# Altium integrated library Connector.IntLib: 152 symbols (continued)
## Header-1*32P (continued)
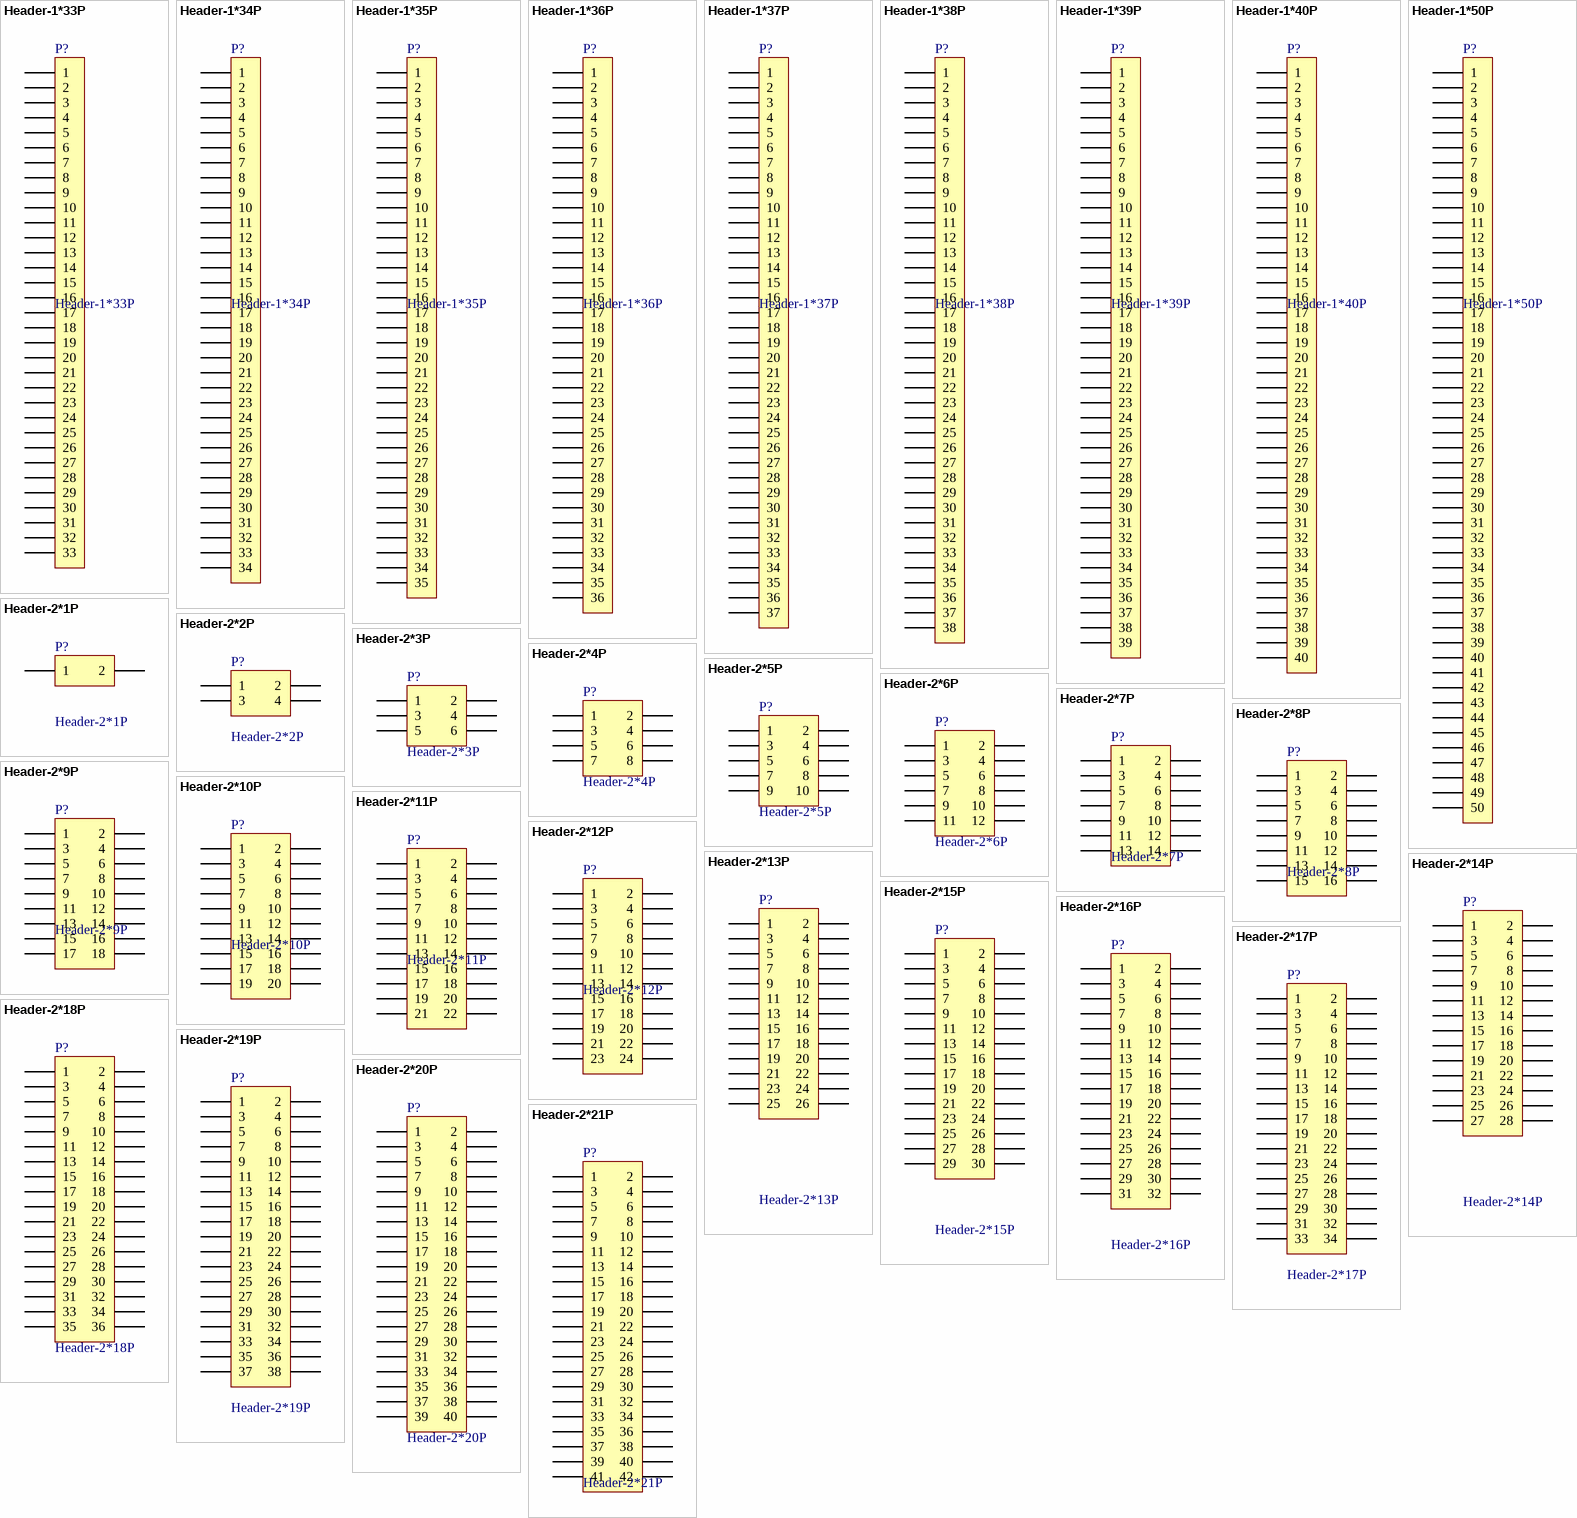
[diagram p6: symbols Header-1*33P to Header-2*21P]

## Header-1*33P
designator P?
Header, 33-Pin
pins: 1, 2, 3, 4, 5, 6, 7, 8, 9, 10, 11, 12, 13, 14, 15, 16, 17, 18, 19, 20, 21, 22, 23, 24, 25, 26, 27, 28, 29, 30, 31, 32, 33

## Header-1*34P
designator P?
Header, 34-Pin; LatestRevisionDate: 17-Jul-2002; LatestRevisionNote: Re-released for DXP Platform.; Publisher: Altium Limited
pins: 1, 2, 3, 4, 5, 6, 7, 8, 9, 10, 11, 12, 13, 14, 15, 16, 17, 18, 19, 20, 21, 22, 23, 24, 25, 26, 27, 28, 29, 30, 31, 32, 33, 34

## Header-1*35P
designator P?
Header, 35-Pin; LatestRevisionDate: 17-Jul-2002; LatestRevisionNote: Re-released for DXP Platform.; Publisher: Altium Limited
pins: 1, 2, 3, 4, 5, 6, 7, 8, 9, 10, 11, 12, 13, 14, 15, 16, 17, 18, 19, 20, 21, 22, 23, 24, 25, 26, 27, 28, 29, 30, 31, 32, 33, 34, 35

## Header-1*36P
designator P?
Header, 36-Pin; LatestRevisionDate: 17-Jul-2002; LatestRevisionNote: Re-released for DXP Platform.; Publisher: Altium Limited
pins: 1, 2, 3, 4, 5, 6, 7, 8, 9, 10, 11, 12, 13, 14, 15, 16, 17, 18, 19, 20, 21, 22, 23, 24, 25, 26, 27, 28, 29, 30, 31, 32, 33, 34, 35, 36

## Header-1*37P
designator P?
Header, 37-Pin; LatestRevisionDate: 17-Jul-2002; LatestRevisionNote: Re-released for DXP Platform.; Publisher: Altium Limited
pins: 1, 2, 3, 4, 5, 6, 7, 8, 9, 10, 11, 12, 13, 14, 15, 16, 17, 18, 19, 20, 21, 22, 23, 24, 25, 26, 27, 28, 29, 30, 31, 32, 33, 34, 35, 36, 37

## Header-1*38P
designator P?
Header, 38-Pin; LatestRevisionDate: 17-Jul-2002; LatestRevisionNote: Re-released for DXP Platform.; Publisher: Altium Limited
pins: 1, 2, 3, 4, 5, 6, 7, 8, 9, 10, 11, 12, 13, 14, 15, 16, 17, 18, 19, 20, 21, 22, 23, 24, 25, 26, 27, 28, 29, 30, 31, 32, 33, 34, 35, 36, 37, 38

## Header-1*39P
designator P?
Header, 39-Pin; LatestRevisionDate: 17-Jul-2002; LatestRevisionNote: Re-released for DXP Platform.; Publisher: Altium Limited
pins: 1, 2, 3, 4, 5, 6, 7, 8, 9, 10, 11, 12, 13, 14, 15, 16, 17, 18, 19, 20, 21, 22, 23, 24, 25, 26, 27, 28, 29, 30, 31, 32, 33, 34, 35, 36, 37, 38, 39

## Header-1*40P
designator P?
Header, 40-Pin; LatestRevisionDate: 17-Jul-2002; LatestRevisionNote: Re-released for DXP Platform.; Publisher: Altium Limited
footprint HEADER_1*40P_FEM_2.0_4.3H
footprint HEADER_1*40P_M_1.27_7.2H
footprint HEADER_1*40P_M_2.0_8.7H
pins: 1, 2, 3, 4, 5, 6, 7, 8, 9, 10, 11, 12, 13, 14, 15, 16, 17, 18, 19, 20, 21, 22, 23, 24, 25, 26, 27, 28, 29, 30, 31, 32, 33, 34, 35, 36, 37, 38, 39, 40

## Header-1*50P
designator P?
Header, 50-Pin; LatestRevisionDate: 17-Jul-2002; LatestRevisionNote: Re-released for DXP Platform.; Publisher: Altium Limited
footprint HEADER_1*50P_M_1.27_7.2H
pins: 1, 2, 3, 4, 5, 6, 7, 8, 9, 10, 11, 12, 13, 14, 15, 16, 17, 18, 19, 20, 21, 22, 23, 24, 25, 26, 27, 28, 29, 30, 31, 32, 33, 34, 35, 36, 37, 38, 39, 40, 41, 42, 43, 44, 45, 46, 47, 48, 49, 50

## Header-2*1P
designator P?
Header, 2*1-Pin, Dual row; LatestRevisionDate: 17-Jul-2002; LatestRevisionNote: Re-released for DXP Platform.; Publisher: Altium Limited
pins: 1, 2

## Header-2*2P
designator P?
Header, 2*2-Pin, Dual row; LatestRevisionDate: 17-Jul-2002; LatestRevisionNote: Re-released for DXP Platform.; Publisher: Altium Limited
footprint HEADER_2*2P_M_2.54_11.5H (Connector; Header; 2x2 Position)
pins: 1, 2, 3, 4

## Header-2*3P
designator P?
Header, 2*3-Pin, Dual row; LatestRevisionDate: 17-Jul-2002; LatestRevisionNote: Re-released for DXP Platform.; Publisher: Altium Limited
footprint HEADER_2*3P_M_2.54_11.5H (Connector; Header; 3x2 Position)
footprint HEADER_2*3P_FEM_2.0_SMT_4.6H_6.5W
footprint HEADER_2*3P_FEM_2.0_SMT_PO_4.6H_6.2W
footprint HEADER_2*3P_M_2.0_SMT_6.5H_6.5W
pins: 1, 2, 3, 4, 5, 6

## Header-2*4P
designator P?
Header, 2*4-Pin, Dual row; LatestRevisionDate: 17-Jul-2002; LatestRevisionNote: Re-released for DXP Platform.; Publisher: Altium Limited
footprint HEADER_2*4P_M_2.54_11.5H (Connector; Header; 4x2 Position)
footprint HEADER_2*4P_FEM_2.0_SMT_4.6H_6.5W
footprint HEADER_2*4P_FEM_2.0_SMT_PO_4.6H_6.2W
footprint HEADER_2*4P_M_2.0_SMT_6.5H_6.5W
pins: 1, 2, 3, 4, 5, 6, 7, 8

## Header-2*5P
designator P?
Header, 2*5-Pin, Dual row; LatestRevisionDate: 17-Jul-2002; LatestRevisionNote: Re-released for DXP Platform.; Publisher: Altium Limited
footprint HEADER_2*5P_M_2.54_11.5H (Connector; Header; 5x2 Position)
footprint HEADER_2*5P_M_2.54_SMT_180D
footprint HEADER_2*5P_FEM_2.0_SMT_4.6H_6.5W
footprint HEADER_2*5P_FEM_2.0_SMT_PO_4.6H_6.2W
footprint HEADER_2*5P_M_2.0_SMT_6.5H_6.5W
pins: 1, 2, 3, 4, 5, 6, 7, 8, 9, 10

## Header-2*6P
designator P?
Header, 2*6-Pin, Dual row; LatestRevisionDate: 17-Jul-2002; LatestRevisionNote: Re-released for DXP Platform.; Publisher: Altium Limited
footprint HEADER_2*6P_M_2.54_11.5H (Connector; Header; 6x2 Position)
footprint HEADER_2*6P_FEM_2.0_SMT_4.6H_6.5W
footprint HEADER_2*6P_FEM_2.0_SMT_PO_4.6H_6.2W
footprint HEADER_2*6P_M_2.0_SMT_6.5H_6.5W
pins: 1, 2, 3, 4, 5, 6, 7, 8, 9, 10, 11, 12

## Header-2*7P
designator P?
Header, 2*7-Pin, Dual row; LatestRevisionDate: 17-Jul-2002; LatestRevisionNote: Re-released for DXP Platform.; Publisher: Altium Limited
footprint HEADER_2*7P_FEM_2.0_SMT_4.6H_6.5W
footprint HEADER_2*7P_FEM_2.0_SMT_PO_4.6H_6.2W
footprint HEADER_2*7P_M_2.0_SMT_6.5H_6.5W
pins: 1, 2, 3, 4, 5, 6, 7, 8, 9, 10, 11, 12, 13, 14

## Header-2*8P
designator P?
Header, 2*8-Pin, Dual row; LatestRevisionDate: 17-Jul-2002; LatestRevisionNote: Re-released for DXP Platform.; Publisher: Altium Limited
footprint HEADER_2*8P_FEM_2.0_SMT_4.6H_6.5W
footprint HEADER_2*8P_FEM_2.0_SMT_PO_4.6H_6.2W
footprint HEADER_2*8P_M_2.0_SMT_6.5H_6.5W
pins: 1, 2, 3, 4, 5, 6, 7, 8, 9, 10, 11, 12, 13, 14, 15, 16

## Header-2*9P
designator P?
Header, 2*9-Pin, Dual row; LatestRevisionDate: 17-Jul-2002; LatestRevisionNote: Re-released for DXP Platform.; Publisher: Altium Limited
pins: 1, 2, 3, 4, 5, 6, 7, 8, 9, 10, 11, 12, 13, 14, 15, 16, 17, 18

## Header-2*10P
designator P?
Header, 2*10-Pin, Dual row; LatestRevisionDate: 17-Jul-2002; LatestRevisionNote: Re-released for DXP Platform.; Publisher: Altium Limited
footprint HEADER_2*10P_FEM_2.0_SMT_4.6H_6.5W
footprint HEADER_2*10P_FEM_2.0_SMT_PO_4.6H_6.2W
footprint HEADER_2*10P_M_2.0_SMT_6.5H_6.5W
footprint HEADER_2*10P_M_2.54_11.5H
pins: 1, 2, 3, 4, 5, 6, 7, 8, 9, 10, 11, 12, 13, 14, 15, 16, 17, 18, 19, 20

## Header-2*11P
designator P?
Header, 2*11-Pin, Dual row; LatestRevisionDate: 17-Jul-2002; LatestRevisionNote: Re-released for DXP Platform.; Publisher: Altium Limited
pins: 1, 2, 3, 4, 5, 6, 7, 8, 9, 10, 11, 12, 13, 14, 15, 16, 17, 18, 19, 20, 21, 22

## Header-2*12P
designator P?
Header, 2*12-Pin, Dual row; LatestRevisionDate: 17-Jul-2002; LatestRevisionNote: Re-released for DXP Platform.; Publisher: Altium Limited
footprint HEADER_2*12P_FEM_2.0_SMT_4.6H_6.5W
footprint HEADER_2*12P_FEM_2.0_SMT_PO_4.6H_6.2W
footprint HEADER_2*12P_M_2.0_SMT_6.5H_6.5W
pins: 1, 2, 3, 4, 5, 6, 7, 8, 9, 10, 11, 12, 13, 14, 15, 16, 17, 18, 19, 20, 21, 22, 23, 24

## Header-2*13P
designator P?
Header, 2*13-Pin, Dual row; LatestRevisionDate: 17-Jul-2002; LatestRevisionNote: Re-released for DXP Platform.; Publisher: Altium Limited
pins: 1, 2, 3, 4, 5, 6, 7, 8, 9, 10, 11, 12, 13, 14, 15, 16, 17, 18, 19, 20, 21, 22, 23, 24, 25, 26

## Header-2*14P
designator P?
Header, 2*14-Pin, Dual row; LatestRevisionDate: 17-Jul-2002; LatestRevisionNote: Re-released for DXP Platform.; Publisher: Altium Limited
pins: 1, 2, 3, 4, 5, 6, 7, 8, 9, 10, 11, 12, 13, 14, 15, 16, 17, 18, 19, 20, 21, 22, 23, 24, 25, 26, 27, 28

## Header-2*15P
designator P?
Header, 2*15-Pin, Dual row; LatestRevisionDate: 17-Jul-2002; LatestRevisionNote: Re-released for DXP Platform.; Publisher: Altium Limited
footprint HEADER_2*15P_FEM_2.0_SMT_4.6H_6.5W
footprint HEADER_2*15P_FEM_2.0_SMT_PO_4.6H_6.2W
footprint HEADER_2*15P_M_2.0_SMT_6.5H_6.5W
footprint HEADER_2*15P_M_2.54_11.5H (Connector; Header; 18x2 Position)
pins: 1, 2, 3, 4, 5, 6, 7, 8, 9, 10, 11, 12, 13, 14, 15, 16, 17, 18, 19, 20, 21, 22, 23, 24, 25, 26, 27, 28, 29, 30

## Header-2*16P
designator P?
Header, 2*16-Pin, Dual row; LatestRevisionDate: 17-Jul-2002; LatestRevisionNote: Re-released for DXP Platform.; Publisher: Altium Limited
pins: 1, 2, 3, 4, 5, 6, 7, 8, 9, 10, 11, 12, 13, 14, 15, 16, 17, 18, 19, 20, 21, 22, 23, 24, 25, 26, 27, 28, 29, 30, 31, 32

## Header-2*17P
designator P?
Header, 2*17-Pin, Dual row; LatestRevisionDate: 17-Jul-2002; LatestRevisionNote: Re-released for DXP Platform.; Publisher: Altium Limited
pins: 1, 2, 3, 4, 5, 6, 7, 8, 9, 10, 11, 12, 13, 14, 15, 16, 17, 18, 19, 20, 21, 22, 23, 24, 25, 26, 27, 28, 29, 30, 31, 32, 33, 34

## Header-2*18P
designator P?
Header, 2*18-Pin, Dual row; LatestRevisionDate: 17-Jul-2002; LatestRevisionNote: Re-released for DXP Platform.; Publisher: Altium Limited
footprint HEADER_2*18P_M_2.54_11.5H (Connector; Header; 18x2 Position)
pins: 1, 2, 3, 4, 5, 6, 7, 8, 9, 10, 11, 12, 13, 14, 15, 16, 17, 18, 19, 20, 21, 22, 23, 24, 25, 26, 27, 28, 29, 30, 31, 32, 33, 34, 35, 36

## Header-2*19P
designator P?
Header, 2*19-Pin, Dual row; LatestRevisionDate: 17-Jul-2002; LatestRevisionNote: Re-released for DXP Platform.; Publisher: Altium Limited
pins: 1, 2, 3, 4, 5, 6, 7, 8, 9, 10, 11, 12, 13, 14, 15, 16, 17, 18, 19, 20, 21, 22, 23, 24, 25, 26, 27, 28, 29, 30, 31, 32, 33, 34, 35, 36, 37, 38

## Header-2*20P
designator P?
Header, 2*20-Pin, Dual row; LatestRevisionDate: 17-Jul-2002; LatestRevisionNote: Re-released for DXP Platform.; Publisher: Altium Limited
footprint HEADER_2*20P_FEM_2.54_8.5H
footprint HEADER_2*20P_FEM_2.0_SMT_4.6H_6.5W
footprint HEADER_2*20P_FEM_2.0_SMT_PO_4.6H_6.2W
footprint HEADER_2*20P_M_2.0_SMT_6.5H_6.5W
footprint HEADER_2*20P_M_2.0_4.3H
pins: 1, 2, 3, 4, 5, 6, 7, 8, 9, 10, 11, 12, 13, 14, 15, 16, 17, 18, 19, 20, 21, 22, 23, 24, 25, 26, 27, 28, 29, 30, 31, 32, 33, 34, 35, 36, 37, 38, 39, 40

## Header-2*21P
designator P?
Header, 2*21-Pin, Dual row
pins: 1, 2, 3, 4, 5, 6, 7, 8, 9, 10, 11, 12, 13, 14, 15, 16, 17, 18, 19, 20, 21, 22, 23, 24, 25, 26, 27, 28, 29, 30, 31, 32, 33, 34, 35, 36, 37, 38, 39, 40, 41, 42

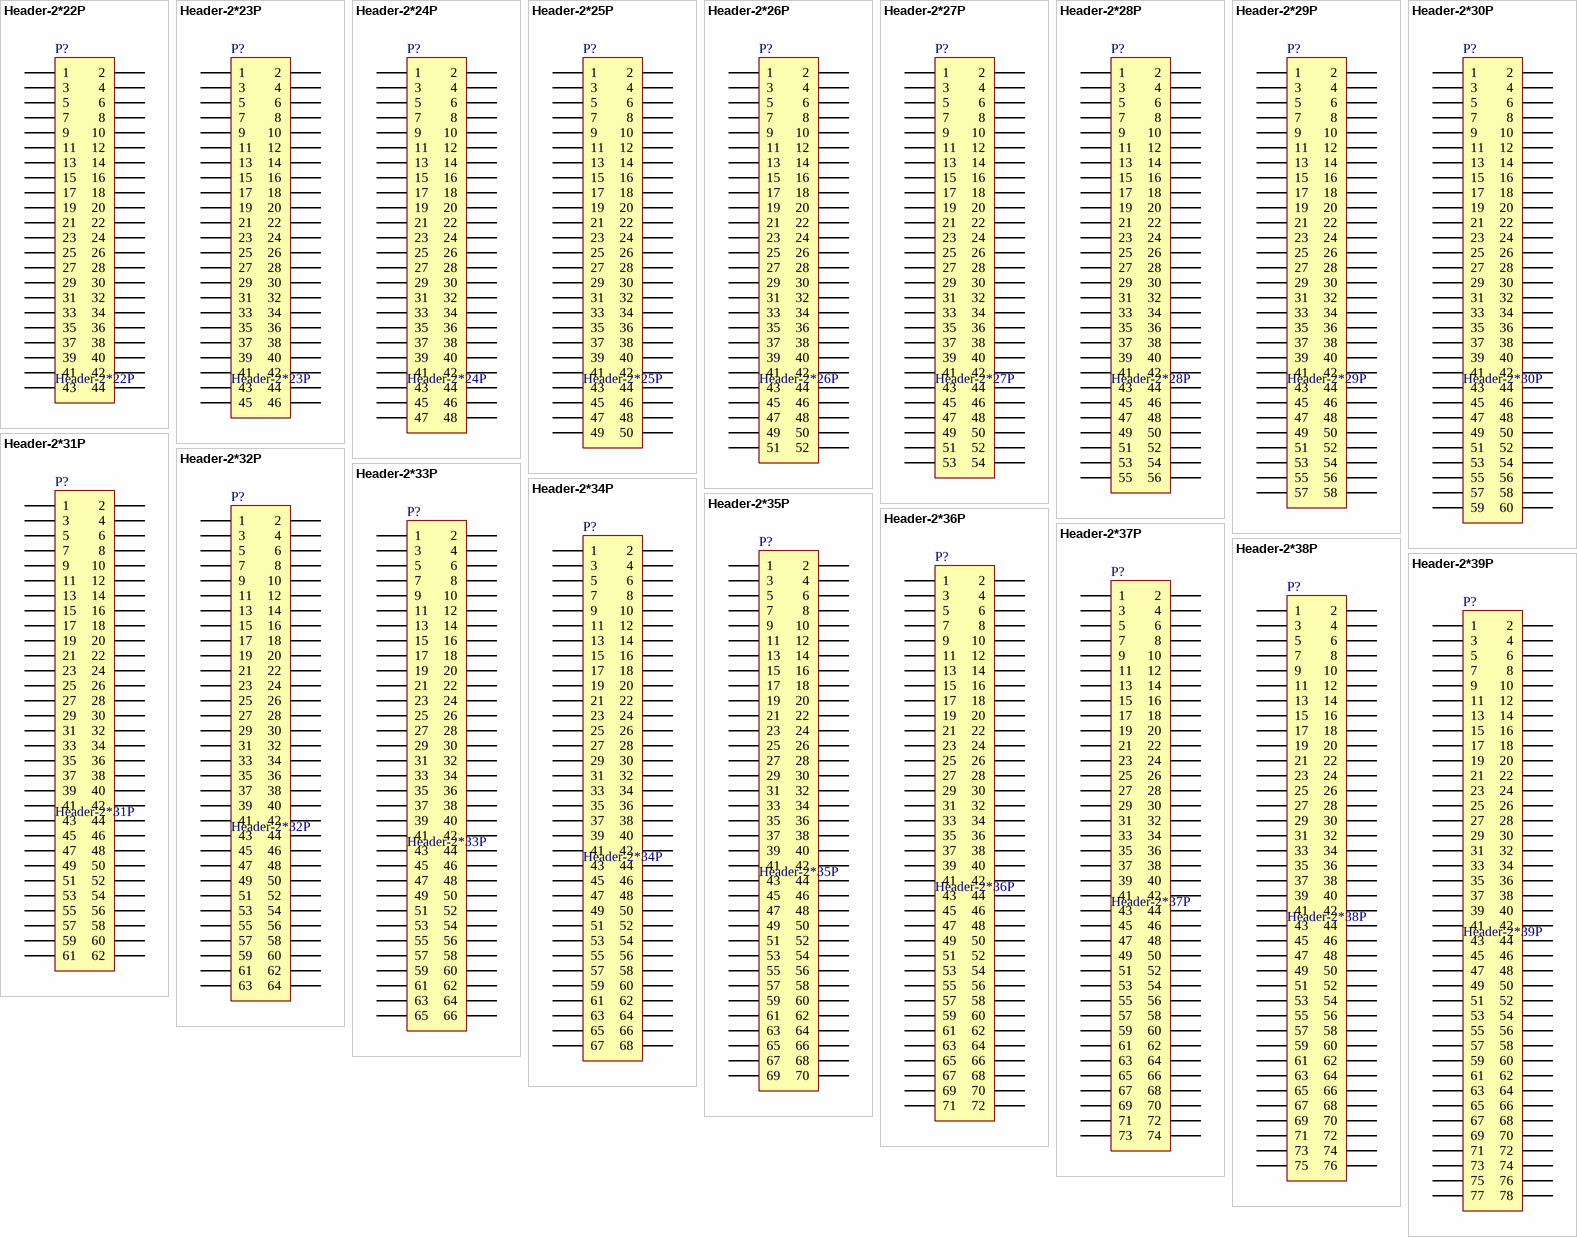
[diagram p7: symbols Header-2*22P to Header-2*39P]

## Header-2*22P
designator P?
Header, 2*22-Pin, Dual row
pins: 1, 2, 3, 4, 5, 6, 7, 8, 9, 10, 11, 12, 13, 14, 15, 16, 17, 18, 19, 20, 21, 22, 23, 24, 25, 26, 27, 28, 29, 30, 31, 32, 33, 34, 35, 36, 37, 38, 39, 40, 41, 42, 43, 44

## Header-2*23P
designator P?
Header, 2*23-Pin, Dual row
pins: 1, 2, 3, 4, 5, 6, 7, 8, 9, 10, 11, 12, 13, 14, 15, 16, 17, 18, 19, 20, 21, 22, 23, 24, 25, 26, 27, 28, 29, 30, 31, 32, 33, 34, 35, 36, 37, 38, 39, 40, 41, 42, 43, 44, 45, 46

## Header-2*24P
designator P?
Header, 2*24-Pin, Dual row
pins: 1, 2, 3, 4, 5, 6, 7, 8, 9, 10, 11, 12, 13, 14, 15, 16, 17, 18, 19, 20, 21, 22, 23, 24, 25, 26, 27, 28, 29, 30, 31, 32, 33, 34, 35, 36, 37, 38, 39, 40, 41, 42, 43, 44, 45, 46, 47, 48

## Header-2*25P
designator P?
Header, 2*25-Pin, Dual row
pins: 1, 2, 3, 4, 5, 6, 7, 8, 9, 10, 11, 12, 13, 14, 15, 16, 17, 18, 19, 20, 21, 22, 23, 24, 25, 26, 27, 28, 29, 30, 31, 32, 33, 34, 35, 36, 37, 38, 39, 40, 41, 42, 43, 44, 45, 46, 47, 48, 49, 50

## Header-2*26P
designator P?
Header, 2*26-Pin, Dual row
pins: 1, 2, 3, 4, 5, 6, 7, 8, 9, 10, 11, 12, 13, 14, 15, 16, 17, 18, 19, 20, 21, 22, 23, 24, 25, 26, 27, 28, 29, 30, 31, 32, 33, 34, 35, 36, 37, 38, 39, 40, 41, 42, 43, 44, 45, 46, 47, 48, 49, 50, 51, 52

## Header-2*27P
designator P?
Header, 2*27-Pin, Dual row
pins: 1, 2, 3, 4, 5, 6, 7, 8, 9, 10, 11, 12, 13, 14, 15, 16, 17, 18, 19, 20, 21, 22, 23, 24, 25, 26, 27, 28, 29, 30, 31, 32, 33, 34, 35, 36, 37, 38, 39, 40, 41, 42, 43, 44, 45, 46, 47, 48, 49, 50, 51, 52, 53, 54

## Header-2*28P
designator P?
Header, 2*28-Pin, Dual row
pins: 1, 2, 3, 4, 5, 6, 7, 8, 9, 10, 11, 12, 13, 14, 15, 16, 17, 18, 19, 20, 21, 22, 23, 24, 25, 26, 27, 28, 29, 30, 31, 32, 33, 34, 35, 36, 37, 38, 39, 40, 41, 42, 43, 44, 45, 46, 47, 48, 49, 50, 51, 52, 53, 54, 55, 56

## Header-2*29P
designator P?
Header, 2*29-Pin, Dual row
pins: 1, 2, 3, 4, 5, 6, 7, 8, 9, 10, 11, 12, 13, 14, 15, 16, 17, 18, 19, 20, 21, 22, 23, 24, 25, 26, 27, 28, 29, 30, 31, 32, 33, 34, 35, 36, 37, 38, 39, 40, 41, 42, 43, 44, 45, 46, 47, 48, 49, 50, 51, 52, 53, 54, 55, 56, 57, 58

## Header-2*30P
designator P?
Header, 2*30-Pin, Dual row
pins: 1, 2, 3, 4, 5, 6, 7, 8, 9, 10, 11, 12, 13, 14, 15, 16, 17, 18, 19, 20, 21, 22, 23, 24, 25, 26, 27, 28, 29, 30, 31, 32, 33, 34, 35, 36, 37, 38, 39, 40, 41, 42, 43, 44, 45, 46, 47, 48, 49, 50, 51, 52, 53, 54, 55, 56, 57, 58, 59, 60

## Header-2*31P
designator P?
Header, 2*31-Pin, Dual row
pins: 1, 2, 3, 4, 5, 6, 7, 8, 9, 10, 11, 12, 13, 14, 15, 16, 17, 18, 19, 20, 21, 22, 23, 24, 25, 26, 27, 28, 29, 30, 31, 32, 33, 34, 35, 36, 37, 38, 39, 40, 41, 42, 43, 44, 45, 46, 47, 48, 49, 50, 51, 52, 53, 54, 55, 56, 57, 58, 59, 60, 61, 62

## Header-2*32P
designator P?
Header, 2*32-Pin, Dual row
pins: 1, 2, 3, 4, 5, 6, 7, 8, 9, 10, 11, 12, 13, 14, 15, 16, 17, 18, 19, 20, 21, 22, 23, 24, 25, 26, 27, 28, 29, 30, 31, 32, 33, 34, 35, 36, 37, 38, 39, 40, 41, 42, 43, 44, 45, 46, 47, 48, 49, 50, 51, 52, 53, 54, 55, 56, 57, 58, 59, 60, 61, 62, 63, 64

## Header-2*33P
designator P?
Header, 2*33-Pin, Dual row
pins: 1, 2, 3, 4, 5, 6, 7, 8, 9, 10, 11, 12, 13, 14, 15, 16, 17, 18, 19, 20, 21, 22, 23, 24, 25, 26, 27, 28, 29, 30, 31, 32, 33, 34, 35, 36, 37, 38, 39, 40, 41, 42, 43, 44, 45, 46, 47, 48, 49, 50, 51, 52, 53, 54, 55, 56, 57, 58, 59, 60, 61, 62, 63, 64, 65, 66

## Header-2*34P
designator P?
Header, 2*34-Pin, Dual row
pins: 1, 2, 3, 4, 5, 6, 7, 8, 9, 10, 11, 12, 13, 14, 15, 16, 17, 18, 19, 20, 21, 22, 23, 24, 25, 26, 27, 28, 29, 30, 31, 32, 33, 34, 35, 36, 37, 38, 39, 40, 41, 42, 43, 44, 45, 46, 47, 48, 49, 50, 51, 52, 53, 54, 55, 56, 57, 58, 59, 60, 61, 62, 63, 64, 65, 66, 67, 68

## Header-2*35P
designator P?
Header, 2*35-Pin, Dual row; LatestRevisionDate: 17-Jul-2002; LatestRevisionNote: Re-released for DXP Platform.; Publisher: Altium Limited
pins: 1, 2, 3, 4, 5, 6, 7, 8, 9, 10, 11, 12, 13, 14, 15, 16, 17, 18, 19, 20, 21, 22, 23, 24, 25, 26, 27, 28, 29, 30, 31, 32, 33, 34, 35, 36, 37, 38, 39, 40, 41, 42, 43, 44, 45, 46, 47, 48, 49, 50, 51, 52, 53, 54, 55, 56, 57, 58, 59, 60, 61, 62, 63, 64, 65, 66, 67, 68, 69, 70

## Header-2*36P
designator P?
Header, 2*36-Pin, Dual row; LatestRevisionDate: 17-Jul-2002; LatestRevisionNote: Re-released for DXP Platform.; Publisher: Altium Limited
pins: 1, 2, 3, 4, 5, 6, 7, 8, 9, 10, 11, 12, 13, 14, 15, 16, 17, 18, 19, 20, 21, 22, 23, 24, 25, 26, 27, 28, 29, 30, 31, 32, 33, 34, 35, 36, 37, 38, 39, 40, 41, 42, 43, 44, 45, 46, 47, 48, 49, 50, 51, 52, 53, 54, 55, 56, 57, 58, 59, 60, 61, 62, 63, 64, 65, 66, 67, 68, 69, 70, 71, 72

## Header-2*37P
designator P?
Header, 2*37-Pin, Dual row; LatestRevisionDate: 17-Jul-2002; LatestRevisionNote: Re-released for DXP Platform.; Publisher: Altium Limited
pins: 1, 2, 3, 4, 5, 6, 7, 8, 9, 10, 11, 12, 13, 14, 15, 16, 17, 18, 19, 20, 21, 22, 23, 24, 25, 26, 27, 28, 29, 30, 31, 32, 33, 34, 35, 36, 37, 38, 39, 40, 41, 42, 43, 44, 45, 46, 47, 48, 49, 50, 51, 52, 53, 54, 55, 56, 57, 58, 59, 60, 61, 62, 63, 64, 65, 66, 67, 68, 69, 70, 71, 72, 73, 74

## Header-2*38P
designator P?
Header, 2*38-Pin, Dual row; LatestRevisionDate: 17-Jul-2002; LatestRevisionNote: Re-released for DXP Platform.; Publisher: Altium Limited
pins: 1, 2, 3, 4, 5, 6, 7, 8, 9, 10, 11, 12, 13, 14, 15, 16, 17, 18, 19, 20, 21, 22, 23, 24, 25, 26, 27, 28, 29, 30, 31, 32, 33, 34, 35, 36, 37, 38, 39, 40, 41, 42, 43, 44, 45, 46, 47, 48, 49, 50, 51, 52, 53, 54, 55, 56, 57, 58, 59, 60, 61, 62, 63, 64, 65, 66, 67, 68, 69, 70, 71, 72, 73, 74, 75, 76

## Header-2*39P
designator P?
Header, 2*39-Pin, Dual row; LatestRevisionDate: 17-Jul-2002; LatestRevisionNote: Re-released for DXP Platform.; Publisher: Altium Limited
pins: 1, 2, 3, 4, 5, 6, 7, 8, 9, 10, 11, 12, 13, 14, 15, 16, 17, 18, 19, 20, 21, 22, 23, 24, 25, 26, 27, 28, 29, 30, 31, 32, 33, 34, 35, 36, 37, 38, 39, 40, 41, 42, 43, 44, 45, 46, 47, 48, 49, 50, 51, 52, 53, 54, 55, 56, 57, 58, 59, 60, 61, 62, 63, 64, 65, 66, 67, 68, 69, 70, 71, 72, 73, 74, 75, 76, 77, 78

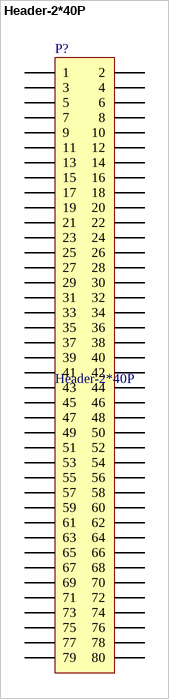
[diagram p8: symbol Header-2*40P]

## Header-2*40P
designator P?
Header, 2*40-Pin, Dual row; LatestRevisionDate: 17-Jul-2002; LatestRevisionNote: Re-released for DXP Platform.; Publisher: Altium Limited
footprint HEADER_2*40P_FEM_2.0_SMT_4.6H_6.5W
footprint HEADER_2*40P_FEM_2.0_SMT_PO_4.6H_6.2W
footprint HEADER_2*40P_M_2.0_SMT_6.5H_6.5W
pins: 1, 2, 3, 4, 5, 6, 7, 8, 9, 10, 11, 12, 13, 14, 15, 16, 17, 18, 19, 20, 21, 22, 23, 24, 25, 26, 27, 28, 29, 30, 31, 32, 33, 34, 35, 36, 37, 38, 39, 40, 41, 42, 43, 44, 45, 46, 47, 48, 49, 50, 51, 52, 53, 54, 55, 56, 57, 58, 59, 60, 61, 62, 63, 64, 65, 66, 67, 68, 69, 70, 71, 72, 73, 74, 75, 76, 77, 78, 79, 80


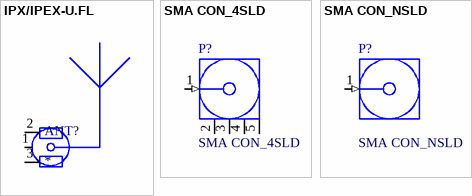
[diagram p9: symbols IPX/IPEX-U.FL to SMA CON_NSLD]

## IPX/IPEX-U.FL
designator ANT?
footprint IPX/IPEX-U.FL_SMT
pins: 1, 2, 3

## SMA CON_4SLD
designator P?
SMA CON; PCB_Layout: Complies with manufacturer's recommendation.; DrillSize: Corresponds to nominal value.; Published: 15-Jul-2004; LatestRevisionDate: 15-Jul-2004; LatestRevisionNote: Component Replaced.; DatasheetDocument: 30-May-2003; PackageDocument: 04-Jul-1999; PackageReference: 919-119J-51AX; Publisher: Altium Limited; ComponentLink1Description: Manufacturer Link; ComponentLink1URL: http://www.amphenolrf.com/
footprint SMA_KE
footprint SMA_KWE
footprint SMA_KHD
pins: 1 Signal (in) "Signal Pin", 2 GND (power), 3 GND (power), 4 GND (power), 5 GND (power)

## SMA CON_NSLD
designator P?
SMA CON; PCB_Layout: Complies with manufacturer's recommendation.; DrillSize: Corresponds to nominal value.; Published: 15-Jul-2004; LatestRevisionDate: 15-Jul-2004; LatestRevisionNote: Component Replaced.; DatasheetDocument: 30-May-2003; PackageDocument: 04-Jul-1999; PackageReference: 919-119J-51AX; Publisher: Altium Limited; ComponentLink1Description: Manufacturer Link; ComponentLink1URL: http://www.amphenolrf.com/
footprint SMA_KFD_NSLD_2PHL
footprint SMA_KFD_NSLD_4PHL
pins: 1 Signal (in) "Signal Pin"


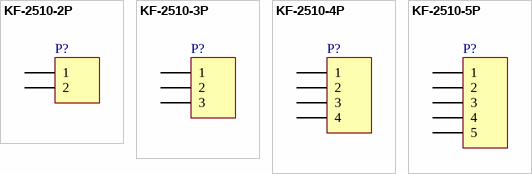
[diagram p10: symbols KF-2510-2P to KF-2510-5P]

## KF-2510-2P
designator P?
Header, 2510,2-Pin; LatestRevisionDate: 17-Jul-2002; LatestRevisionNote: Re-released for DXP Platform.; Publisher: Altium Limited
footprint KF2510-2.54_2P_AW
pins: 1, 2

## KF-2510-3P
designator P?
Header, 2510,3-Pin; LatestRevisionDate: 17-Jul-2002; LatestRevisionNote: Re-released for DXP Platform.; Publisher: Altium Limited
footprint KF2510-2.54_3P_AW
pins: 1, 2, 3

## KF-2510-4P
designator P?
Header, 2510,4-Pin; LatestRevisionDate: 17-Jul-2002; LatestRevisionNote: Re-released for DXP Platform.; Publisher: Altium Limited
footprint KF2510-2.54_4P_AW
pins: 1, 2, 3, 4

## KF-2510-5P
designator P?
Header, 2510,5-Pin; LatestRevisionDate: 17-Jul-2002; LatestRevisionNote: Re-released for DXP Platform.; Publisher: Altium Limited
footprint KF2510-2.54_5P_AW
pins: 1, 2, 3, 4, 5


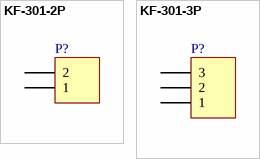
[diagram p11: symbols KF-301-2P to KF-301-3P]

## KF-301-2P
designator P?
Header, kf301,2-Pin; LatestRevisionDate: 17-Jul-2002; LatestRevisionNote: Re-released for DXP Platform.; Publisher: Altium Limited
footprint KF301-5.08_2P
pins: 1, 2

## KF-301-3P
designator P?
Header, kf301,3-Pin; LatestRevisionDate: 17-Jul-2002; LatestRevisionNote: Re-released for DXP Platform.; Publisher: Altium Limited
footprint KF301-5.08_3P
pins: 1, 2, 3


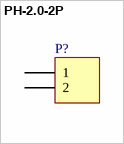
[diagram p12: symbol PH-2.0-2P]

## PH-2.0-2P
designator P?
Header, 2-Pin; LatestRevisionDate: 17-Jul-2002; LatestRevisionNote: Re-released for DXP Platform.; Publisher: Altium Limited
footprint PH-2.0_2P_A
footprint PH-2.0_2P_AW
pins: 1, 2


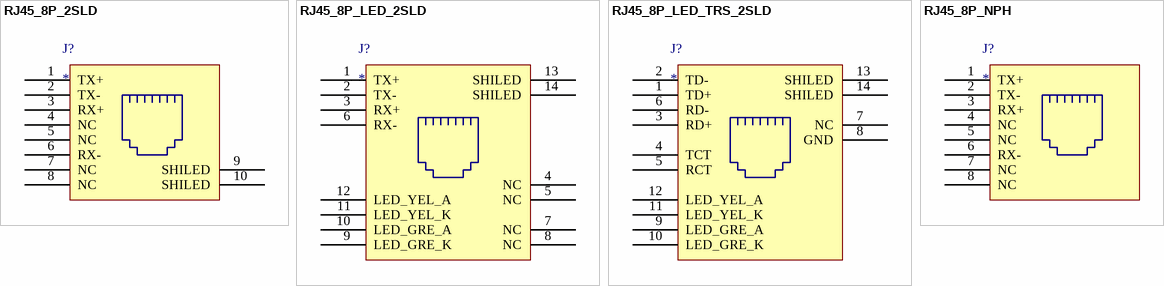
[diagram p13: symbols RJ45_8P_2SLD to RJ45_8P_NPH]

## RJ45_8P_2SLD
designator J?
footprint RJ45-8P_18.4L*15.8W*13.35H (Ckmtw R-RJ45R10P-B000)
footprint RJ45-8P_15.75L*16.26W*13.1H (Ckmtw,R-RJ45R08P-B000)
pins: 1 TX+, 2 TX-, 3 RX+, 4 NC, 5 NC, 6 RX-, 7 NC, 8 NC, 9 SHILED, 10 SHILED

## RJ45_8P_LED_2SLD
designator J?
footprint RJ45-8P-LED_15.75L*16.51W*13.46H (HR911103A)
pins: 1 TX+, 2 TX-, 3 RX+, 4 NC, 5 NC, 6 RX-, 7 NC, 8 NC, 9 LED_GRE_K, 10 LED_GRE_A, 11 LED_YEL_K, 12 LED_YEL_A, 13 SHILED, 14 SHILED

## RJ45_8P_LED_TRS_2SLD
designator J?
footprint RJ45-8P-LED_21.3L*16W*13.5H (HR911103A)
pins: 1 TD+, 2 TD-, 3 RD+, 4 TCT, 5 RCT, 6 RD-, 7 NC, 8 GND, 9 LED_GRE_A, 10 LED_GRE_K, 11 LED_YEL_K, 12 LED_YEL_A, 13 SHILED, 14 SHILED

## RJ45_8P_NPH
designator J?
footprint RJ45-8P_15.1L*15.9W*12.6H
pins: 1 TX+, 2 TX-, 3 RX+, 4 NC, 5 NC, 6 RX-, 7 NC, 8 NC


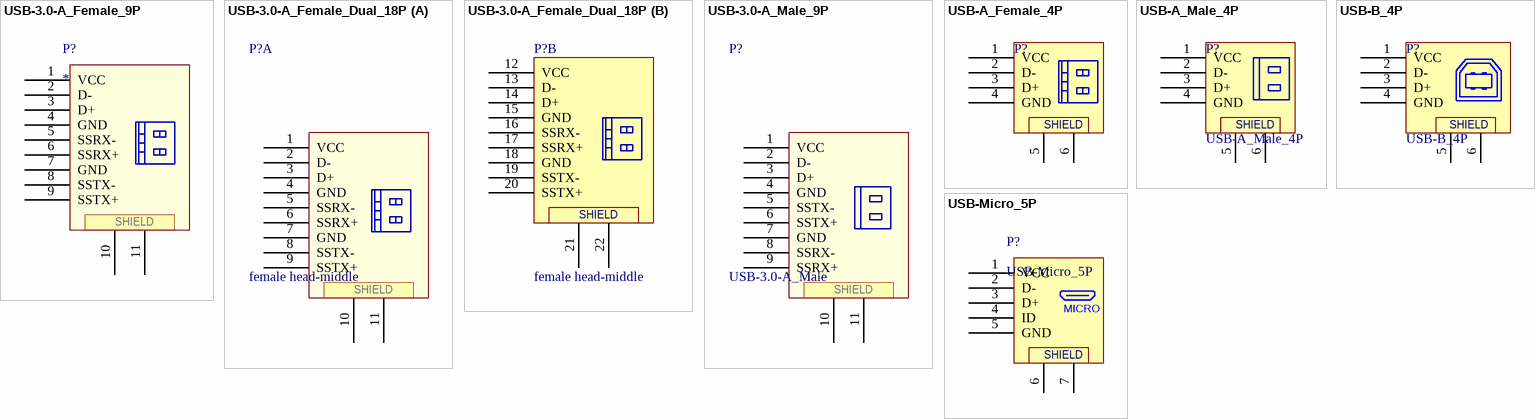
[diagram p14: symbols USB-3.0-A_Female_9P to USB-Micro_5P]

## USB-3.0-A_Female_9P
designator P?
footprint USB3.0-A_FEMALE_90_KPIN
footprint USB3.0-A_FEMALE_180_KPIN
footprint USB3.0-A_FEMALE_90_SIDE
footprint USB3.0-A_FEM_180_11.5H_NEC
pins: 1 VCC, 2 D-, 3 D+, 4 GND, 5 SSRX-, 6 SSRX+, 7 GND, 8 SSTX-, 9 SSTX+, 10 SHIELD, 11 SHIELD

## USB-3.0-A_Female_Dual_18P
designator P?, comment female head-middle
footprint USB3.0-A_FEMALE_DUAL_90_KPIN
part A pins: 1 VCC, 2 D-, 3 D+, 4 GND, 5 SSRX-, 6 SSRX+, 7 GND, 8 SSTX-, 9 SSTX+, 10 SHIELD, 11 SHIELD
part B pins: 12 VCC, 13 D-, 14 D+, 15 GND, 16 SSRX-, 17 SSRX+, 18 GND, 19 SSTX-, 20 SSTX+, 21 SGIELD, 22 SHIELD

## USB-3.0-A_Male_9P
designator P?, comment USB-3.0-A_Male
footprint USB3.0-A_MALE_90_SMT
pins: 1 VCC, 2 D-, 3 D+, 4 GND, 5 SSTX-, 6 SSTX+, 7 GND, 8 SSRX-, 9 SSRX+, 10 SHIELD, 11 SHIELD

## USB-A_Female_4P
designator P?
USB Port
footprint USB-A_FEMALE_90_KPIN
pins: 1 VCC, 2 D- , 3 D+, 4 GND, 5 SHIELD, 6 SHIELD

## USB-A_Male_4P
designator P?
USB Port
footprint USB-A_MALE_90
pins: 1 VCC, 2 D- , 3 D+, 4 GND, 5 SHIELD, 6 SHIELD

## USB-B_4P
designator P?
footprint USB-B_FEMALE_90_KPIN
pins: 1 VCC, 2 D-, 3 D+, 4 GND, 5 SHIELD, 6 SHIELD

## USB-Micro_5P
designator P?
MicroUSB接口
footprint USB-MICRO_5P_FEMALE_SMT (MICRO USB接口，2个SMT焊盘固定，后侧无固定柱)
footprint USB-MICRO_5P_FEMALE (MICRO USB接口，2个直插焊盘固定，后侧牛角形2个固定柱)
pins: 1 VCC, 2 D- , 3 D+, 4 ID, 5 GND, 6 SHIELD, 7 SHIELD
text: MICRO


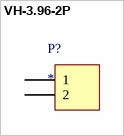
[diagram p15: symbol VH-3.96-2P]

## VH-3.96-2P
designator P?
footprint VH-3.96_2P_A
footprint VH-3.96_2P_AW
footprint VH-3.96_2P_AWT
pins: 1, 2


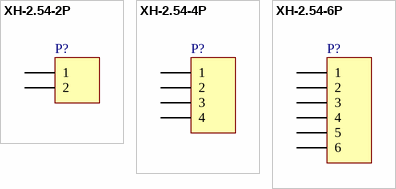
[diagram p16: symbols XH-2.54-2P to XH-2.54-6P]

## XH-2.54-2P
designator P?
LatestRevisionDate: 17-Jul-2002; LatestRevisionNote: Re-released for DXP Platform.; Publisher: Altium Limited
footprint XH-2.54_2P_A
footprint XH-2.54_2P_AW
pins: 1, 2

## XH-2.54-4P
designator P?
LatestRevisionDate: 17-Jul-2002; LatestRevisionNote: Re-released for DXP Platform.; Publisher: Altium Limited
footprint XH-2.54_4P_A
footprint XH-2.54_4P_AW
pins: 1, 2, 3, 4

## XH-2.54-6P
designator P?
LatestRevisionDate: 17-Jul-2002; LatestRevisionNote: Re-released for DXP Platform.; Publisher: Altium Limited
footprint XH-2.54_6P_A
pins: 1, 2, 3, 4, 5, 6


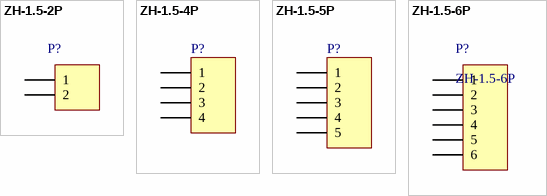
[diagram p17: symbols ZH-1.5-2P to ZH-1.5-6P]

## ZH-1.5-2P
designator P?
footprint ZH-1.5_2P_A
footprint ZH-1.5_2P_AW
pins: 1, 2

## ZH-1.5-4P
designator P?
LatestRevisionDate: 17-Jul-2002; LatestRevisionNote: Re-released for DXP Platform.; Publisher: Altium Limited
footprint ZH-1.5_4P_AW
footprint ZH-1.5_4P_A
pins: 1, 2, 3, 4

## ZH-1.5-5P
designator P?
LatestRevisionDate: 17-Jul-2002; LatestRevisionNote: Re-released for DXP Platform.; Publisher: Altium Limited
footprint ZH-1.5_5P_AW
pins: 1, 2, 3, 4, 5

## ZH-1.5-6P
designator P?
ZH1.5-6P
footprint ZH-1.5_6P_AW
pins: 1, 2, 3, 4, 5, 6